# Altium footprint library LUMI_Handy_Soldering_LIB.PcbLib: 562 footprints (part 2 of 36)
Each footprint in its own frame and in the unit in brackets; x right, y up, seen from the top. Pads: shape width x height; smd on the part's side, far side on the other; paste and mask are expansions set on the pad; w line width, h text height; cw(c..) or ccw(c..) is an arc to the next point about the centre after c.
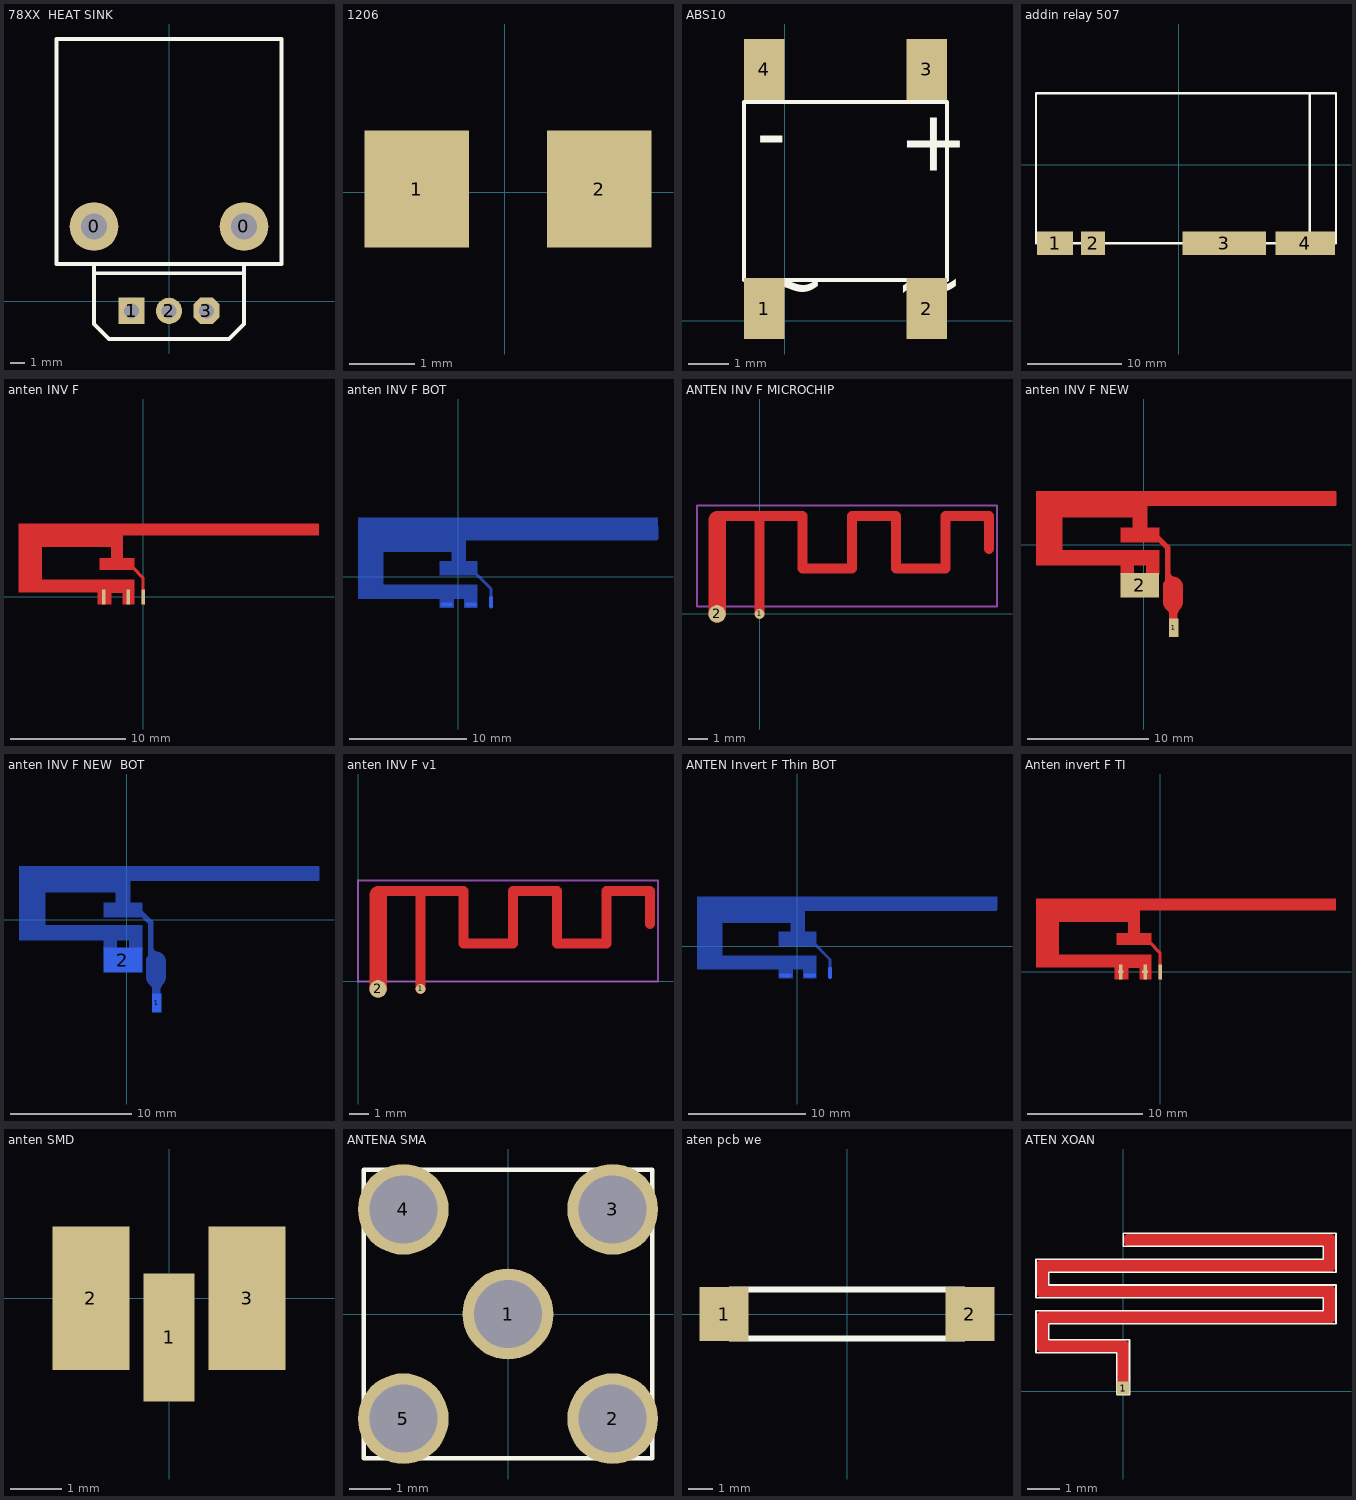
[diagram p1: the footprints below, top view; thin cyan lines are the x and y axes]

## 78XX  HEAT SINK [mil]
pads (5):
  round 130 hole 70: 0(-200,200) 0(200,200)
  rect 70x70 hole 40: 1(-100,-25)
  round 70 hole 40: 2(0,-25)
  oct 70x70 hole 40: 3(100,-25)
Top Overlay:
  lines w10: -200,75 -200,100 ; -200,75 -200,-60 -160,-100 160,-100 200,-60 200,75 ; -200,75 200,75 ; -200,100 200,100 ; -200,100 -300,100 -300,700 300,700 300,100 200,100 ; 200,75 200,100
3D body: height 854.72, standoff -300, extent -220.72,-83.85 220.73,100.8
3D body: height 984.25, standoff 19.68, extent -300,100 300,700
3D body: height 196.85, standoff -196.85, extent -229.29,170.54 -170.47,229.48
3D body: height 196.85, standoff -196.85, extent 170.71,170.54 229.53,229.48

## 1206 [mm]
pads (2):
  rect 1.6x1.8 smd: 1(-1.349,0.051) 2(1.451,0.051)
Bottom Overlay:
  lines w0.2: -0.249,-0.749 0.351,-0.749 ; -0.249,0.851 0.351,0.851
3D body: height 0.57, standoff 0, extent -1.499,-0.739 1.601,0.813

## ABS10 [mm]
pads (4):
  rect 1x1.5 smd: 1(-0.5,0.3) 2(3.5,0.3) 3(3.5,6.2) 4(-0.5,6.2)
Top Overlay:
  lines w0.1: -1,1 -1,5.4 4,5.4 4,1 -1,1
  text "-" at -0.7,3.9 h1.52
  text "+" at 2.8,3.7 h1.52
  text "~" at -0.7,0.2 h1.52
  text "~" at 2.7,0.2 h1.52
3D body: height 1.5, standoff 0.2, extent -1,1 4,5.4

## addin relay 507 [mil]
pads (4):
  rect 150x100 smd: 1(-520,-330)
  rect 100x100 smd: 2(-360,-330)
  rect 350x100 smd: 3(190,-330)
  rect 250x100 smd: 4(530,-330)
Top Overlay:
  lines w10: 550,-330 550,300 ; -600,-330 -600,300 660,300 660,-330 -600,-330
3D body: height 492.13, standoff 0, extent -600,-436.22 660,300

## anten INV F [mm]
pads (6):
  rect 0.3x1.3 smd paste-0.3 mask-0.3: 1(-0.009,0.009) 1(-0.009,0.009) 2(-1.304,0.009) 2(-1.304,0.009) 3(-3.412,0.009) 3(-3.412,0.009)
Top Layer:
  region: -0.136,1.558 -0.161,1.634 -0.999,2.473 -0.771,2.6 0.118,1.711 0.118,1.558
  region: 0.118,-0.652 -0.136,-0.652 -0.136,1.572 0.118,1.572
  region: -0.769,-0.652 -1.769,-0.652 -1.769,0.348 -2.769,0.348 -2.769,-0.652 -3.918,-0.652 -3.918,0.415 -10.751,0.415 -10.751,6.348 15.231,6.348 15.231,5.348 -1.769,5.348 -1.769,3.348 -0.769,3.348 -0.769,2.348 -3.769,2.348 -3.769,3.348 -2.769,3.348 -2.769,4.348 -8.769,4.348 -8.769,1.482 -0.769,1.482
Top Solder:
  region: -0.769,-0.652 -1.769,-0.652 -1.769,0.348 -2.769,0.348 -2.769,-0.652 -3.918,-0.652 -3.918,0.415 -10.751,0.415 -10.751,6.348 15.231,6.348 15.231,5.348 -1.769,5.348 -1.769,3.348 -0.769,3.348 -0.769,2.348 -3.769,2.348 -3.769,3.348 -2.769,3.348 -2.769,4.348 -8.769,4.348 -8.769,1.482 -0.769,1.482
  region: -0.136,1.558 -0.161,1.634 -0.999,2.473 -0.771,2.6 0.118,1.711 0.118,1.558
  region: 0.118,-0.652 -0.136,-0.652 -0.136,1.572 0.118,1.572

## anten INV F BOT [mm]
pads (3):
  oval 0.3x1 smd far side: 1(2.794,-2.159)
  oval 1x0.3 smd far side: 2(1.092,-2.362) 3(-0.991,-2.362)
Bottom Layer:
  rectangle: -8.542,4.318 17.018,5.055
  region: 17.018,3.202 16.928,3.112 0.631,3.122 0.631,1.328 1.63,1.328 1.63,0.122 -1.567,0.122 -1.567,1.328 -0.568,1.328 -0.568,2.125 -6.382,2.128 -6.382,-0.682 1.638,-0.682 1.638,-2.622 0.518,-2.622 0.518,-1.862 -0.382,-1.862 -0.382,-2.622 -1.582,-2.622 -1.582,-1.862 -8.542,-1.862 -8.542,2.115 -8.542,4.318 17.018,4.318
  lines w0.25: 1.27,0.508 2.794,-1.016 2.794,-2.54

## ANTEN INV F MICROCHIP [mil]
pads (2):
  round 19.68 smd: 1(0,0)
  round 35 smd: 2(-85,0)
Top Layer:
  lines w20: -85,195 86,195 86,91 184.5,91 184.5,195 ; 0,0 0,193 ; 185,195 272,195 272,91 370.5,91 ; 371,91 371,195 458,195 458,130
  lines w35: -85,0 -85,187.5
Mechanical 15:
  lines w4: 473.43,15 -125,15 -125,216.81 473.74,216.81 473.74,15

## anten INV F NEW [mil]
pads (2):
  rect 30x60 smd: 1(97.98,-270)
  rect 125x80 smd: 2(-12.02,-131)
Top Layer:
  rectangle: -350,-68 51,-17
  rectangle: -36,56 12,175
  rectangle: -76,8 52,56
  rectangle: -350,88 12,175
  rectangle: -350,-68 -264,175
  rectangle: 4.5,129.37 625.56,172.68
  rectangle: 85.2,-277.13 109.81,-206.26
  rectangle: 85.18,-277.31 109.79,-217.27
  rectangle: 82.24,-111.59 90.12,-99.78
  rectangle: 87.15,-276.33 109.79,-213.34
  rectangle: 14.49,22.27 51.89,56.72
  rectangle: -75.07,9.29 50.91,56.53
  rectangle: 14.33,22.27 51.73,56.72
  rectangle: -75.23,9.29 50.76,56.53
  rectangle: 83.21,-277.31 109.79,-212.35
  rectangle: -76,-97 -31,-65
  rectangle: 7,-96 51,-64
  rectangle: -71.14,-99.78 -34.88,-93.87
  rectangle: 7.45,-135.39 31.07,-64.01
  rectangle: 7.61,-135.39 31.23,-64.01
  rectangle: 21.06,-146.04 42.48,-93.87
  lines w3.94: 65.5,-180.67 cw(c71.41,-184.61) 75.35,-178.7 ; 84.21,-94.05 ccw(c95.52,-93.56) 96.02,-104.88 ; 85.19,-89.13 ccw(c99.95,-90.12) 98.97,-104.88
  lines w5: -344.22,172.68 624.56,172.68 ; -43.75,129.37 624.56,129.37 ; 72.39,-117.68 69.68,-120.39 ccw(c79.76,-130.47) 65.5,-130.47 65.5,-188.74 ccw(c88.79,-188.74) 72.32,-205.21 79.33,-212.22 ccw(c91.09,-200.45) 91.09,-217.09 ; 74.46,-207.34 78.4,-211.28 cw(c54.87,-234.8) 88.14,-234.8 ; 91.09,-215.22 91.09,-196.42 ; 91.09,-186.57 91.09,-195.36 ccw(c107.9,-195.36) 96.02,-207.24 ; 107.83,-231.85 cw(c143.47,-231.85) 118.27,-206.65 119.64,-205.28 ; 112.75,-196.92 112.75,-182.64 ; 597.98,172.68 624.56,172.68 ; 599.95,129.37 624.56,129.37 ; 624.56,130.35 624.56,172.68 ; 624.56,148.07 624.56,129.37 ; 624.56,160.87 624.56,172.68
  lines w6: 109.79,-121.62 cw(c109.79,-126.37) 113.15,-123.01 117.89,-127.74 cw(c99.4,-146.22) 125.54,-146.22
  lines w10: 84.2,-208.23 cw(c84.2,-212.98) 87.56,-209.62
  lines w18.11: 39.09,30.15 78.09,-8.85 78.09,-129.01 ; 87.02,-150.77 93.14,-150.77
  lines w64.96: 96.02,-186.57 96.02,-135.21

## anten INV F NEW  BOT [mil]
pads (2):
  rect 30x60 smd far side: 1(97.98,-270)
  rect 125x80 smd far side: 2(-12.02,-131)
Bottom Layer:
  rectangle: -350,-68 51,-17
  rectangle: -36,56 12,175
  rectangle: -76,8 52,56
  rectangle: -350,88 12,175
  rectangle: -350,-68 -264,175
  rectangle: 4.5,129.37 625.56,172.68
  rectangle: 85.2,-277.13 109.81,-206.26
  rectangle: 85.18,-277.31 109.79,-217.27
  rectangle: 82.24,-111.59 90.12,-99.78
  rectangle: 87.15,-276.33 109.79,-213.34
  rectangle: 14.49,22.27 51.89,56.72
  rectangle: -75.07,9.29 50.91,56.53
  rectangle: 14.33,22.27 51.73,56.72
  rectangle: -75.23,9.29 50.76,56.53
  rectangle: 83.21,-277.31 109.79,-212.35
  rectangle: -76,-97 -31,-65
  rectangle: 7,-96 51,-64
  rectangle: -71.14,-99.78 -34.88,-93.87
  rectangle: 7.45,-135.39 31.07,-64.01
  rectangle: 7.61,-135.39 31.23,-64.01
  rectangle: 21.06,-146.04 42.48,-93.87
  lines w3.94: 65.5,-180.67 cw(c71.41,-184.61) 75.35,-178.7 ; 84.21,-94.05 ccw(c95.52,-93.56) 96.02,-104.88 ; 85.19,-89.13 ccw(c99.95,-90.12) 98.97,-104.88
  lines w5: -344.22,172.68 624.56,172.68 ; -43.75,129.37 624.56,129.37 ; 72.39,-117.68 69.68,-120.39 ccw(c79.76,-130.47) 65.5,-130.47 65.5,-188.74 ccw(c88.79,-188.74) 72.32,-205.21 79.33,-212.22 ccw(c91.09,-200.45) 91.09,-217.09 ; 74.46,-207.34 78.4,-211.28 cw(c54.87,-234.8) 88.14,-234.8 ; 91.09,-215.22 91.09,-196.42 ; 91.09,-186.57 91.09,-195.36 ccw(c107.9,-195.36) 96.02,-207.24 ; 107.83,-231.85 cw(c143.47,-231.85) 118.27,-206.65 119.64,-205.28 ; 112.75,-196.92 112.75,-182.64 ; 597.98,172.68 624.56,172.68 ; 599.95,129.37 624.56,129.37 ; 624.56,130.35 624.56,172.68 ; 624.56,148.07 624.56,129.37 ; 624.56,160.87 624.56,172.68
  lines w6: 109.79,-121.62 cw(c109.79,-126.37) 113.15,-123.01 117.89,-127.74 cw(c99.4,-146.22) 125.54,-146.22
  lines w10: 84.2,-208.23 cw(c84.2,-212.98) 87.56,-209.62
  lines w18.11: 39.09,30.15 78.09,-8.85 78.09,-129.01 ; 87.02,-150.77 93.14,-150.77
  lines w64.96: 96.02,-186.57 96.02,-135.21

## anten INV F v1 [mil]
pads (2):
  round 19.68 smd: 1(125,-15)
  round 35 smd: 2(40,-15)
Top Layer:
  lines w20: 40,180 211,180 211,76 309.5,76 309.5,180 ; 125,-15 125,178 ; 310,180 397,180 397,76 495.5,76 ; 496,76 496,180 583,180 583,115
  lines w35: 40,-15 40,172.5
Mechanical 15:
  lines w4: 598.43,0 0,0 0,201.81 598.74,201.81 598.74,0

## ANTEN Invert F Thin BOT [mm]
pads (3):
  oval 0.3x1 smd far side: 1(2.794,-2.286)
  oval 1x0.3 smd far side: 2(1.092,-2.489) 3(-0.991,-2.489)
Bottom Layer:
  region: 17.018,3.075 16.928,2.985 0.631,2.995 0.631,1.201 1.63,1.201 1.63,-0.005 -1.567,-0.005 -1.567,1.201 -0.568,1.201 -0.568,1.998 -6.382,2.001 -6.382,-0.809 1.638,-0.809 1.638,-2.749 0.518,-2.749 0.518,-1.989 -0.382,-1.989 -0.382,-2.749 -1.582,-2.749 -1.582,-1.989 -8.542,-1.989 -8.542,1.988 -8.542,4.191 17.018,4.191
  lines w0.25: 1.27,0.381 2.794,-1.143 2.794,-2.667

## Anten invert F TI [mm]
pads (6):
  rect 0.2x0.5 smd: 1(0,0)
  rect 0.3x1.3 smd paste-0.3 mask-0.3: 1(0,0) 2(-1.295,0) 3(-3.404,0)
  rect 0.5x0.2 smd: 2(-3.404,0) 2(-1.295,0)
Top Layer:
  region: -0.76,-0.66 -1.76,-0.66 -1.76,0.34 -2.76,0.34 -2.76,-0.66 -3.91,-0.66 -3.91,0.406 -10.742,0.406 -10.742,6.34 15.24,6.34 15.24,5.34 -1.76,5.34 -1.76,3.34 -0.76,3.34 -0.76,2.34 -3.76,2.34 -3.76,3.34 -2.76,3.34 -2.76,4.34 -8.76,4.34 -8.76,1.473 -0.76,1.473
  region: 0.127,-0.66 -0.127,-0.66 -0.127,1.563 0.127,1.563
  region: -0.127,1.549 -0.152,1.626 -0.991,2.464 -0.762,2.591 0.127,1.702 0.127,1.549

## anten SMD [mm]
pads (3):
  rect 1x2.5 smd: 1(0,-0.762)
  rect 1.5x2.8 smd: 2(-1.524,0) 3(1.524,0)
3D body: height 1.5, standoff 0.24, extent -1.524,-1.55 1.476,1.55

## ANTENA SMA [mm]
pads (5):
  round 2.2 hole 1.65: 1(0,0) 2(2.54,-2.54) 3(2.54,2.54) 4(-2.54,2.54)
  round 2.2 hole 1.65 mask+0.102: 5(-2.54,-2.54)
Top Overlay:
  lines w0.102: -3.5,-2.5 -3.5,-2 ; -3.5,2 -3.5,2.5 ; -3.5,-3.5 3.5,-3.5 3.5,3.5 -3.5,3.5 -3.5,-3.5
3D body: height 9.86, standoff -4.24, extent -11.55,-3.5 3.55,3.5

## aten pcb we [mm]
pads (2):
  rect 2x2.2 smd: 1(-5,0) 2(5,0)
Top Overlay:
  lines w0.254: -4.75,-1 4.75,-1 4.75,1 -4.75,1 -4.75,-1
3D body: height 1.2, standoff 0.1, extent -4.75,-1 4.75,1

## ATEN XOAN [mm]
pads (1):
  rect 0.4x0.4 smd: 1(0,0.1)
Top Layer:
  lines w0.4: 0,0.1 0,1.4 -2.5,1.4 -2.5,2.3 6.4,2.3 6.4,3.1 -2.5,3.1 -2.5,3.9 6.4,3.9 6.4,4.7 0.2,4.7
Top Overlay:
  lines w0.05: -2.7,1.2 -0.2,1.2 -0.2,-0.1 0.2,-0.1 0.2,1.6 0,1.6 -2.3,1.6 -2.3,2.1 6.6,2.1 6.6,3.1 6.6,3.3 -2.3,3.3 -2.3,3.7 6.2,3.7 6.6,3.7 6.6,4.9 0,4.9 0,4.5 1.4,4.5 6.2,4.5 6.2,4.1 -2.7,4.1 -2.7,3.9 -2.7,2.9 6.2,2.9 6.2,2.5 0.5,2.5 -2.7,2.5 -2.7,1.2